# Altium footprint library devices.PCBLIB: 335 footprints (part 13 of 21)
Each footprint in its own frame and in the unit in brackets; x right, y up, seen from the top. Pads: shape width x height; smd on the part's side, far side on the other; paste and mask are expansions set on the pad; w line width, h text height; cw(c..) or ccw(c..) is an arc to the next point about the centre after c.
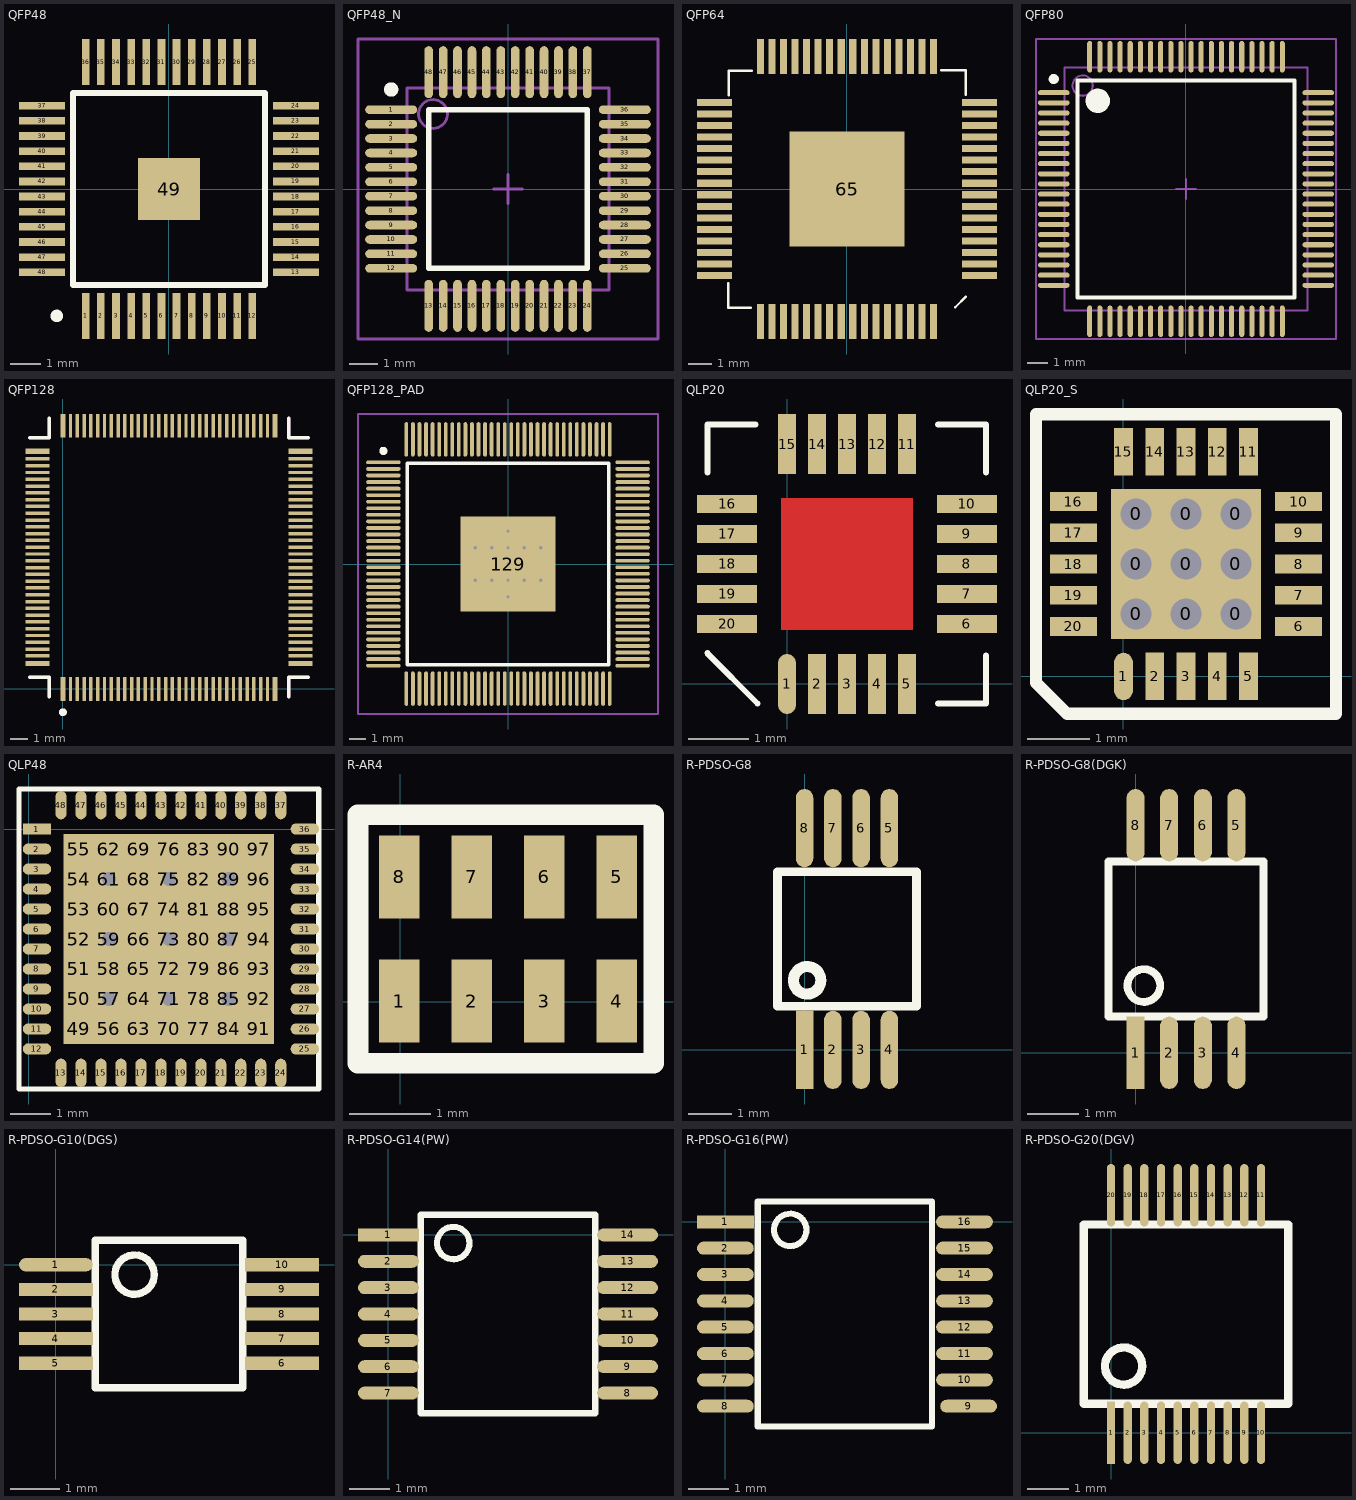
[diagram p12: the footprints below, top view; thin cyan lines are the x and y axes]

## QFP48 [mil]
pads (49):
  rect 10x60 smd: 1(-108.27,-165) 2(-88.58,-165) 3(-68.9,-165) 4(-49.21,-165) 5(-29.53,-165) 6(-9.84,-165) 7(9.84,-165) 8(29.53,-165) 9(49.21,-165) 10(68.9,-165) 11(88.58,-165) 12(108.27,-165) 25(108.27,165) 26(88.58,165) 27(68.9,165) 28(49.21,165) 29(29.53,165) 30(9.84,165) 31(-9.84,165) 32(-29.53,165) 33(-49.21,165) 34(-68.9,165) 35(-88.58,165) 36(-108.27,165)
  rect 60x10 smd: 13(165,-108.27) 14(165,-88.58) 15(165,-68.9) 16(165,-49.21) 17(165,-29.53) 18(165,-9.84) 19(165,9.84) 20(165,29.53) 21(165,49.21) 22(165,68.9) 23(165,88.58) 24(165,108.27) 37(-165,108.27) 38(-165,88.58) 39(-165,68.9) 40(-165,49.21) 41(-165,29.53) 42(-165,9.84) 43(-165,-9.84) 44(-165,-29.53) 45(-165,-49.21) 46(-165,-68.9) 47(-165,-88.58) 48(-165,-108.27)
  rect 80x80 smd: 49(0,0)
Top Overlay:
  circle w8: c-145.81,-165 r4.19
  lines w8: -125,-125 125,-125 125,125 -125,125 -125,-125

## QFP48_N [mm] "Thin QFP, 48-Leads, Body 7x7mm, Pitch 0.5mm, IPC Medium Density"
height 1.2
pads (48):
  oval 1.8x0.3 smd: 1(-4.05,2.75) 2(-4.05,2.25) 3(-4.05,1.75) 4(-4.05,1.25) 5(-4.05,0.75) 6(-4.05,0.25) 7(-4.05,-0.25) 8(-4.05,-0.75) 9(-4.05,-1.25) 10(-4.05,-1.75) 11(-4.05,-2.25) 12(-4.05,-2.75) 25(4.05,-2.75) 26(4.05,-2.25) 27(4.05,-1.75) 28(4.05,-1.25) 29(4.05,-0.75) 30(4.05,-0.25) 31(4.05,0.25) 32(4.05,0.75) 33(4.05,1.25) 34(4.05,1.75) 35(4.05,2.25) 36(4.05,2.75)
  oval 0.3x1.8 smd: 13(-2.75,-4.05) 14(-2.25,-4.05) 15(-1.75,-4.05) 16(-1.25,-4.05) 17(-0.75,-4.05) 18(-0.25,-4.05) 19(0.25,-4.05) 20(0.75,-4.05) 21(1.25,-4.05) 22(1.75,-4.05) 23(2.25,-4.05) 24(2.75,-4.05) 37(2.75,4.05) 38(2.25,4.05) 39(1.75,4.05) 40(1.25,4.05) 41(0.75,4.05) 42(0.25,4.05) 43(-0.25,4.05) 44(-0.75,4.05) 45(-1.25,4.05) 46(-1.75,4.05) 47(-2.25,4.05) 48(-2.75,4.05)
Top Overlay:
  circle w0.25: c-4.05,3.45 r0.125
  lines w0.2: -2.75,-2.75 2.75,-2.75 2.75,2.75 -2.75,2.75 -2.75,-2.75
Mechanical 13:
  circle w0.1: c-2.6,2.6 r0.5
  lines w0.1: -3.5,-3.5 3.5,-3.5 3.5,3.5 -3.5,3.5 -3.5,-3.5
Mechanical 15:
  lines w0.1: -0.5,0 0.5,0 ; 0,-0.5 0,0.5 ; -5.2,-5.2 5.2,-5.2 5.2,5.2 -5.2,5.2 -5.2,-5.2
3D body: height 1.2, standoff 0, extent -3.5,-3.5 3.5,3.5

## QFP64 [mil]
pads (65):
  rect 60x12 smd: 1(226.5,-147.76) 2(226.5,-128.03) 3(226.5,-108.35) 4(226.5,-88.66) 5(226.5,-68.94) 6(226.5,-49.25) 7(226.5,-29.57) 8(226.5,-9.84) 9(226.5,9.84) 10(226.5,29.57) 11(226.5,49.25) 12(226.5,68.94) 13(226.5,88.66) 14(226.5,108.35) 15(226.5,128.03) 16(226.5,147.76) 33(-226.5,147.76) 34(-226.5,128.03) 35(-226.5,108.35) 36(-226.5,88.66) 37(-226.5,68.94) 38(-226.5,49.25) 39(-226.5,29.57) 40(-226.5,9.84) 41(-226.5,-9.84) 42(-226.5,-29.57) 43(-226.5,-49.25) 44(-226.5,-68.94) 45(-226.5,-88.66) 46(-226.5,-108.35) 47(-226.5,-128.03) 48(-226.5,-147.76)
  rect 12x60 smd: 17(147.76,226.5) 18(128.03,226.5) 19(108.35,226.5) 20(88.66,226.5) 21(68.94,226.5) 22(49.25,226.5) 23(29.57,226.5) 24(9.84,226.5) 25(-9.84,226.5) 26(-29.57,226.5) 27(-49.25,226.5) 28(-68.94,226.5) 29(-88.66,226.5) 30(-108.35,226.5) 31(-128.03,226.5) 32(-147.76,226.5) 49(-147.76,-226.5) 50(-128.03,-226.5) 51(-108.35,-226.5) 52(-88.66,-226.5) 53(-68.94,-226.5) 54(-49.25,-226.5) 55(-29.57,-226.5) 56(-9.84,-226.5) 57(9.84,-226.5) 58(29.57,-226.5) 59(49.25,-226.5) 60(68.94,-226.5) 61(88.66,-226.5) 62(108.35,-226.5) 63(128.03,-226.5) 64(147.76,-226.5)
  rect 197x197 smd: 65(0,0)
Top Overlay:
  lines w4: -202.94,-161 -202.94,-203.51 -203.4,-203.51 -203.4,-203.28 -164.57,-203.28 ; -202.47,159.8 -202.47,202.2 -163.09,202.2 ; 160.63,202.6 160.63,202.87 202.8,202.87 202.8,160.97 ; 185.08,-202.32 203.58,-183.82 ; 203.58,-183.82 203.58,-183.81
Top Paste:
  pour cut-out: 89.04,-88.81 89.04,-20.91 20.59,-20.91 20.59,-88.81
  pour cut-out: -19.65,-88.83 -19.65,-20.93 -88.1,-20.93 -88.1,-88.83
  pour cut-out: -20.16,20.39 -20.16,88.29 -88.61,88.29 -88.61,20.39
  pour cut-out: 89.57,20.41 89.57,88.31 21.12,88.31 21.12,20.41

## QFP80 [mm] "Thin QFP, 80-Leads, Body 12x12mm, Pitch 0.5mm, IPC High Density"
height 1.6
pads (80):
  oval 1.55x0.25 smd: 1(-6.525,4.75) 2(-6.525,4.25) 3(-6.525,3.75) 4(-6.525,3.25) 5(-6.525,2.75) 6(-6.525,2.25) 7(-6.525,1.75) 8(-6.525,1.25) 9(-6.525,0.75) 10(-6.525,0.25) 11(-6.525,-0.25) 12(-6.525,-0.75) 13(-6.525,-1.25) 14(-6.525,-1.75) 15(-6.525,-2.25) 16(-6.525,-2.75) 17(-6.525,-3.25) 18(-6.525,-3.75) 19(-6.525,-4.25) 20(-6.525,-4.75) 41(6.525,-4.75) 42(6.525,-4.25) 43(6.525,-3.75) 44(6.525,-3.25) 45(6.525,-2.75) 46(6.525,-2.25) 47(6.525,-1.75) 48(6.525,-1.25) 49(6.525,-0.75) 50(6.525,-0.25) 51(6.525,0.25) 52(6.525,0.75) 53(6.525,1.25) 54(6.525,1.75) 55(6.525,2.25) 56(6.525,2.75) 57(6.525,3.25) 58(6.525,3.75) 59(6.525,4.25) 60(6.525,4.75)
  oval 0.25x1.55 smd: 21(-4.75,-6.525) 22(-4.25,-6.525) 23(-3.75,-6.525) 24(-3.25,-6.525) 25(-2.75,-6.525) 26(-2.25,-6.525) 27(-1.75,-6.525) 28(-1.25,-6.525) 29(-0.75,-6.525) 30(-0.25,-6.525) 31(0.25,-6.525) 32(0.75,-6.525) 33(1.25,-6.525) 34(1.75,-6.525) 35(2.25,-6.525) 36(2.75,-6.525) 37(3.25,-6.525) 38(3.75,-6.525) 39(4.25,-6.525) 40(4.75,-6.525) 61(4.75,6.525) 62(4.25,6.525) 63(3.75,6.525) 64(3.25,6.525) 65(2.75,6.525) 66(2.25,6.525) 67(1.75,6.525) 68(1.25,6.525) 69(0.75,6.525) 70(0.25,6.525) 71(-0.25,6.525) 72(-0.75,6.525) 73(-1.25,6.525) 74(-1.75,6.525) 75(-2.25,6.525) 76(-2.75,6.525) 77(-3.25,6.525) 78(-3.75,6.525) 79(-4.25,6.525) 80(-4.75,6.525)
Top Overlay:
  circle w0.25: c-6.525,5.425 r0.125
  circle w0.6: c-4.35,4.35 r0.3
  lines w0.2: -5.35,-5.35 -5.35,5.35 5.35,5.35 5.35,-5.35 -5.35,-5.35
Mechanical 13:
  circle w0.1: c-5.1,5.1 r0.5
  lines w0.1: -6,-6 -6,6 6,6 6,-6 -6,-6
Mechanical 15:
  lines w0.1: -0.5,0 0.5,0 ; 0,-0.5 0,0.5 ; -7.4,-7.4 -7.4,7.4 7.4,7.4 7.4,-7.4 -7.4,-7.4
3D body: height 1.6, standoff 0, extent -6,-6 6,6

## QFP128 [mil]
pads (128):
  rect 12x55 smd: 1(0,0) 32(492.18,0) 65(492.18,610) 96(0,610)
  rect 8x55 smd: 2(17.74,0) 3(33.49,0) 4(49.24,0) 5(64.99,0) 6(80.74,0) 7(96.48,0) 8(112.23,0) 9(127.98,0) 10(143.73,0) 11(159.48,0) 12(175.22,0) 13(190.97,0) 14(206.72,0) 15(222.47,0) 16(238.22,0) 17(253.96,0) 18(269.71,0) 19(285.46,0) 20(301.21,0) 21(316.96,0) 22(332.7,0) 23(348.45,0) 24(364.2,0) 25(379.95,0) 26(395.7,0) 27(411.44,0) 28(427.19,0) 29(442.94,0) 30(458.69,0) 31(474.44,0) 66(474.44,610) 67(458.69,610) 68(442.94,610) 69(427.19,610) 70(411.44,610) 71(395.7,610) 72(379.95,610) 73(364.2,610) 74(348.45,610) 75(332.7,610) 76(316.96,610) 77(301.21,610) 78(285.46,610) 79(269.71,610) 80(253.96,610) 81(238.22,610) 82(222.47,610) 83(206.72,610) 84(190.97,610) 85(175.22,610) 86(159.48,610) 87(143.73,610) 88(127.98,610) 89(112.23,610) 90(96.48,610) 91(80.74,610) 92(64.99,610) 93(49.24,610) 94(33.49,610) 95(17.74,610)
  rect 55x12 smd: 33(551.09,58.91) 64(551.09,551.09) 97(-58.91,551.09) 128(-58.91,58.91)
  rect 55x8 smd: 34(551.09,76.65) 35(551.09,92.4) 36(551.09,108.15) 37(551.09,123.9) 38(551.09,139.65) 39(551.09,155.39) 40(551.09,171.14) 41(551.09,186.89) 42(551.09,202.64) 43(551.09,218.39) 44(551.09,234.13) 45(551.09,249.88) 46(551.09,265.63) 47(551.09,281.38) 48(551.09,297.13) 49(551.09,312.87) 50(551.09,328.62) 51(551.09,344.37) 52(551.09,360.12) 53(551.09,375.87) 54(551.09,391.61) 55(551.09,407.36) 56(551.09,423.11) 57(551.09,438.86) 58(551.09,454.61) 59(551.09,470.35) 60(551.09,486.1) 61(551.09,501.85) 62(551.09,517.6) 63(551.09,533.35) 98(-58.91,533.35) 99(-58.91,517.6) 100(-58.91,501.85) 101(-58.91,486.1) 102(-58.91,470.35) 103(-58.91,454.61) 104(-58.91,438.86) 105(-58.91,423.11) 106(-58.91,407.36) 107(-58.91,391.61) 108(-58.91,375.87) 109(-58.91,360.12) 110(-58.91,344.37) 111(-58.91,328.62) 112(-58.91,312.87) 113(-58.91,297.13) 114(-58.91,281.38) 115(-58.91,265.63) 116(-58.91,249.88) 117(-58.91,234.13) 118(-58.91,218.39) 119(-58.91,202.64) 120(-58.91,186.89) 121(-58.91,171.14) 122(-58.91,155.39) 123(-58.91,139.65) 124(-58.91,123.9) 125(-58.91,108.15) 126(-58.91,92.4) 127(-58.91,76.65)
Top Overlay:
  circle w10: c0.09,-54 r4.12
  lines w8: -76.74,27.44 -31.47,27.44 -31.47,-17.83 ; -76.74,582.56 -31.47,582.56 -31.47,627.83 ; 523.65,-17.83 523.65,27.44 568.92,27.44 ; 523.65,627.83 523.65,582.56 568.92,582.56
Mechanical 11:
  lines w8: -76.74,27.44 -31.47,27.44 -31.47,-17.83 ; -76.74,582.56 -31.47,582.56 -31.47,627.83 ; 523.65,-17.83 523.65,27.44 568.92,27.44 ; 523.65,627.83 523.65,582.56 568.92,582.56

## QFP128_PAD [mm]
pads (129):
  oval 2.1x0.23 smd: 1(-7.6,6.2) 2(-7.6,5.8) 3(-7.6,5.4) 4(-7.6,5) 5(-7.6,4.6) 6(-7.6,4.2) 7(-7.6,3.8) 8(-7.6,3.4) 9(-7.6,3) 10(-7.6,2.6) 11(-7.6,2.2) 12(-7.6,1.8) 13(-7.6,1.4) 14(-7.6,1) 15(-7.6,0.6) 16(-7.6,0.2) 17(-7.6,-0.2) 18(-7.6,-0.6) 19(-7.6,-1) 20(-7.6,-1.4) 21(-7.6,-1.8) 22(-7.6,-2.2) 23(-7.6,-2.6) 24(-7.6,-3) 25(-7.6,-3.4) 26(-7.6,-3.8) 27(-7.6,-4.2) 28(-7.6,-4.6) 29(-7.6,-5) 30(-7.6,-5.4) 31(-7.6,-5.8) 32(-7.6,-6.2) 65(7.6,-6.2) 66(7.6,-5.8) 67(7.6,-5.4) 68(7.6,-5) 69(7.6,-4.6) 70(7.6,-4.2) 71(7.6,-3.8) 72(7.6,-3.4) 73(7.6,-3) 74(7.6,-2.6) 75(7.6,-2.2) 76(7.6,-1.8) 77(7.6,-1.4) 78(7.6,-1) 79(7.6,-0.6) 80(7.6,-0.2) 81(7.6,0.2) 82(7.6,0.6) 83(7.6,1) 84(7.6,1.4) 85(7.6,1.8) 86(7.6,2.2) 87(7.6,2.6) 88(7.6,3) 89(7.6,3.4) 90(7.6,3.8) 91(7.6,4.2) 92(7.6,4.6) 93(7.6,5) 94(7.6,5.4) 95(7.6,5.8) 96(7.6,6.2)
  oval 0.23x2.1 smd: 33(-6.2,-7.6) 34(-5.8,-7.6) 35(-5.4,-7.6) 36(-5,-7.6) 37(-4.6,-7.6) 38(-4.2,-7.6) 39(-3.8,-7.6) 40(-3.4,-7.6) 41(-3,-7.6) 42(-2.6,-7.6) 43(-2.2,-7.6) 44(-1.8,-7.6) 45(-1.4,-7.6) 46(-1,-7.6) 47(-0.6,-7.6) 48(-0.2,-7.6) 49(0.2,-7.6) 50(0.6,-7.6) 51(1,-7.6) 52(1.4,-7.6) 53(1.8,-7.6) 54(2.2,-7.6) 55(2.6,-7.6) 56(3,-7.6) 57(3.4,-7.6) 58(3.8,-7.6) 59(4.2,-7.6) 60(4.6,-7.6) 61(5,-7.6) 62(5.4,-7.6) 63(5.8,-7.6) 64(6.2,-7.6) 97(6.2,7.6) 98(5.8,7.6) 99(5.4,7.6) 100(5,7.6) 101(4.6,7.6) 102(4.2,7.6) 103(3.8,7.6) 104(3.4,7.6) 105(3,7.6) 106(2.6,7.6) 107(2.2,7.6) 108(1.8,7.6) 109(1.4,7.6) 110(1,7.6) 111(0.6,7.6) 112(0.2,7.6) 113(-0.2,7.6) 114(-0.6,7.6) 115(-1,7.6) 116(-1.4,7.6) 117(-1.8,7.6) 118(-2.2,7.6) 119(-2.6,7.6) 120(-3,7.6) 121(-3.4,7.6) 122(-3.8,7.6) 123(-4.2,7.6) 124(-4.6,7.6) 125(-5,7.6) 126(-5.4,7.6) 127(-5.8,7.6) 128(-6.2,7.6)
  rect 5.8x5.8 smd: 129(0,0)
via 0,0 diameter 0.508 hole 0.203
via 0,1 diameter 0.508 hole 0.203
via 0,-1 diameter 0.508 hole 0.203
via 0,2 diameter 0.508 hole 0.203
via -1,1 diameter 0.508 hole 0.203
via -1,-1 diameter 0.508 hole 0.203
via 1,-1 diameter 0.508 hole 0.203
via 1,1 diameter 0.508 hole 0.203
via 0,-2 diameter 0.508 hole 0.203
via -2,1 diameter 0.508 hole 0.203
via -2,-1 diameter 0.508 hole 0.203
via 2,1 diameter 0.508 hole 0.203
via 2,-1 diameter 0.508 hole 0.203
Top Overlay:
  circle w0.25: c-7.6,6.9 r0.125
  lines w0.2: -6.15,-6.15 6.15,-6.15 6.15,6.15 -6.15,6.15 -6.15,-6.15
Mechanical 15:
  lines w0.1: -0.5,0 0.5,0 ; 0,-0.5 0,0.5 ; -9.15,-9.15 9.15,-9.15 9.15,9.15 -9.15,9.15 -9.15,-9.15

## QLP20 [mm]
pads (20):
  oval 0.3x1 smd: 1(0,0)
  rect 0.3x1 smd: 2(0.5,0) 3(1,0) 4(1.5,0) 5(2,0) 11(2,4) 12(1.5,4) 13(1,4) 14(0.5,4) 15(0,4)
  rect 1x0.3 smd: 6(3,1) 7(3,1.5) 8(3,2) 9(3,2.5) 10(3,3) 16(-1,3) 17(-1,2.5) 18(-1,2) 19(-1,1.5) 20(-1,1)
Top Layer:
  rectangle: -0.1,0.9 2.1,3.1
Top Overlay:
  lines w0.1: -1.329,0.514 -0.491,-0.324 ; -1.329,3.524 -1.329,4.324 -0.529,4.324 ; 2.519,-0.324 3.319,-0.324 3.319,0.476 ; 2.519,4.324 3.319,4.324 3.319,3.524

## QLP20_S [mm]
pads (29):
  rect 0.8x0.8 hole 0.5: 0(0.2,1) 0(0.2,1.8) 0(0.2,2.6) 0(1,1) 0(1,1.8) 0(1,2.6) 0(1.8,1) 0(1.8,1.8) 0(1.8,2.6)
  oval 0.3x0.76 smd: 1(0,0)
  rect 0.3x0.76 smd: 2(0.5,0) 3(1,0) 4(1.5,0) 5(2,0) 11(2,3.6) 12(1.5,3.6) 13(1,3.6) 14(0.5,3.6) 15(0,3.6)
  rect 0.76x0.3 smd: 6(2.8,0.8) 7(2.8,1.3) 8(2.8,1.8) 9(2.8,2.3) 10(2.8,2.8) 16(-0.8,2.8) 17(-0.8,2.3) 18(-0.8,1.8) 19(-0.8,1.3) 20(-0.8,0.8)
Top Overlay:
  lines w0.2: -1.4,-0.1 -1.4,4.2 3.4,4.2 3.4,-0.6 -0.9,-0.6 -1.4,-0.1

## QLP48 [mil]
pads (123):
  rect 0x0 / inner round 0 / far side round 0 all layers, no hole: 1(0,0) 2(0,-19.69) 3(0,-39.37) 4(0,-59.06) 5(0,-78.74) 6(0,-98.43) 7(0,-118.11) 8(0,-137.8) 9(0,-157.48) 10(0,-177.17) 14(50.79,-247.64) 15(70.47,-247.64) 17(109.84,-247.64) 18(129.53,-247.64) 19(149.21,-247.64) 20(168.9,-247.64) 21(188.58,-247.64) 22(208.27,-247.64) 23(227.95,-247.64) 24(247.64,-247.64) 25(278.74,-216.54) 26(278.74,-196.85)
  rect 28x11 smd: 1(7.87,0)
  oval 28x11 smd: 2(7.87,-19.68) 3(7.87,-39.37) 4(7.87,-59.05) 5(7.87,-78.74) 6(7.87,-98.42) 7(7.87,-118.11) 8(7.87,-137.79) 9(7.87,-157.48) 10(7.87,-177.16) 11(7.87,-196.85) 12(7.87,-216.53) 25(271.65,-216.53) 26(271.65,-196.85) 27(271.65,-177.16) 28(271.65,-157.48) 29(271.65,-137.79) 30(271.65,-118.11) 31(271.65,-98.42) 32(271.65,-78.74) 33(271.65,-59.05) 34(271.65,-39.37) 35(271.65,-19.68) 36(271.65,0)
  round 0 all layers, no hole: 11(0,-196.85) 12(0,-216.54) 13(31.1,-247.64) 16(90.16,-247.64)
  oval 11x28 smd: 13(31.5,-240.16) 14(51.18,-240.16) 15(70.87,-240.16) 16(90.55,-240.16) 17(110.24,-240.16) 18(129.92,-240.16) 19(149.61,-240.16) 20(169.29,-240.16) 21(188.98,-240.16) 22(208.66,-240.16) 23(228.35,-240.16) 24(248.03,-240.16) 37(248.03,23.62) 38(228.35,23.62) 39(208.66,23.62) 40(188.98,23.62) 41(169.29,23.62) 42(149.61,23.62) 43(129.92,23.62) 44(110.24,23.62) 45(90.55,23.62) 46(70.87,23.62) 47(51.18,23.62) 48(31.5,23.62)
  rect 30x30 smd: 49(49.21,-196.85) 50(49.21,-167.32) 51(49.21,-137.8) 52(49.21,-108.27) 53(49.21,-78.74) 54(49.21,-49.21) 55(49.21,-19.69) 56(78.74,-196.85) 58(78.74,-137.8) 60(78.74,-78.74) 62(78.74,-19.69) 63(108.27,-196.85) 64(108.27,-167.32) 65(108.27,-137.8) 66(108.27,-108.27) 67(108.27,-78.74) 68(108.27,-49.21) 69(108.27,-19.69) 70(137.8,-196.85) 72(137.8,-137.8) 74(137.8,-78.74) 76(137.8,-19.69) 77(167.32,-196.85) 78(167.32,-167.32) 79(167.32,-137.8) 80(167.32,-108.27) 81(167.32,-78.74) 82(167.32,-49.21) 83(167.32,-19.69) 84(196.85,-196.85) 86(196.85,-137.8) 88(196.85,-78.74) 90(196.85,-19.69) 91(226.38,-196.85) 92(226.38,-167.32) 93(226.38,-137.8) 94(226.38,-108.27) 95(226.38,-78.74) 96(226.38,-49.21) 97(226.38,-19.69)
  rect 30x30 hole 14: 57(78.74,-167.32) 59(78.74,-108.27) 61(78.74,-49.21) 71(137.8,-167.32) 73(137.8,-108.27) 75(137.8,-49.21) 85(196.85,-167.32) 87(196.85,-108.27) 89(196.85,-49.21)
Top Overlay:
  lines w5: -9.84,-255.91 285.43,-255.91 285.43,39.37 -9.84,39.37 -9.84,-255.91

## R-AR4 [mm]
pads (8):
  rect 0.5x1.016 smd: 1(-0.012,0.011) 2(0.877,0.011) 3(1.766,0.011) 4(2.655,0.011) 5(2.655,1.535) 6(1.766,1.535) 7(0.877,1.535) 8(-0.012,1.535)
Top Overlay:
  lines w0.254: 3.061,-0.751 -0.52,-0.751 -0.52,2.297 3.112,2.297 3.112,-0.751

## R-PDSO-G8 [mm]
pads (8):
  rect 0.4x1.8 smd: 1(0,0)
  oval 0.4x1.8 smd: 2(0.65,0) 3(1.3,0) 4(1.95,0) 5(1.95,5.1) 6(1.3,5.1) 7(0.65,5.1) 8(0,5.1)
Top Overlay:
  circle w0.254: c0.059,1.6 r0.316
  lines w0.2: -0.625,1 -0.625,4.1 2.575,4.1 2.575,1 -0.625,1

## R-PDSO-G8(DGK) [mm]
pads (8):
  rect 0.35x1.4 smd: 1(0,0)
  oval 0.35x1.4 smd: 2(0.65,0) 3(1.3,0) 4(1.95,0) 5(1.95,4.4) 6(1.3,4.4) 7(0.65,4.4) 8(0,4.4)
Top Overlay:
  circle w0.15: c0.159,1.3 r0.316
  lines w0.15: -0.525,0.7 -0.525,3.7 2.475,3.7 2.475,0.7 -0.525,0.7

## R-PDSO-G10(DGS) [mm]
pads (10):
  oval 1.5x0.27 smd: 1(0,0)
  rect 1.5x0.27 smd: 2(0,-0.5) 3(0,-1) 4(0,-1.5) 5(0,-2) 6(4.6,-2) 7(4.6,-1.5) 8(4.6,-1) 9(4.6,-0.5) 10(4.6,0)
Top Overlay:
  circle w0.15: c1.6,-0.2 r0.4
  lines w0.152: 0.8,-2.5 0.8,0.5 3.8,0.5 3.8,-2.5 0.8,-2.5

## R-PDSO-G14(PW) [mm]
pads (14):
  rect 1.5x0.32 smd: 1(0,0)
  oval 1.5x0.32 smd: 2(0,-0.65) 3(0,-1.3) 4(0,-1.95) 5(0,-2.6) 6(0,-3.25) 7(0,-3.9) 8(5.9,-3.9) 9(5.9,-3.25) 10(5.9,-2.6) 11(5.9,-1.95) 12(5.9,-1.3) 13(5.9,-0.65) 14(5.9,0)
Top Overlay:
  circle w0.15: c1.6,-0.2 r0.4
  lines w0.152: 5.093,-4.4 0.8,-4.4 0.8,0.5 5.1,0.5 5.1,-4.4

## R-PDSO-G16(PW) [mm]
pads (16):
  rect 1.4x0.32 smd: 1(0,0)
  oval 1.4x0.32 smd: 2(0,-0.65) 3(0,-1.3) 4(0,-1.95) 5(0,-2.6) 6(0,-3.25) 7(0,-3.9) 8(0,-4.55) 9(6,-4.55) 10(5.9,-3.9) 11(5.9,-3.25) 12(5.9,-2.6) 13(5.9,-1.95) 14(5.9,-1.3) 15(5.9,-0.65) 16(5.9,0)
Top Overlay:
  circle w0.15: c1.6,-0.2 r0.4
  lines w0.152: 5.093,-5.05 0.8,-5.05 0.8,0.5 5.1,0.5 5.1,-5.05

## R-PDSO-G20(DGV) [mm]
pads (20):
  rect 0.2x1.5 smd: 1(0,0)
  oval 0.2x1.5 smd: 2(0.4,0) 3(0.8,0) 4(1.2,0) 5(1.6,0) 6(2,0) 7(2.4,0) 8(2.8,0) 9(3.2,0) 10(3.6,0) 11(3.6,5.7) 12(3.2,5.7) 13(2.8,5.7) 14(2.4,5.7) 15(2,5.7) 16(1.6,5.7) 17(1.2,5.7) 18(0.8,5.7) 19(0.4,5.7) 20(0,5.7)
Top Overlay:
  circle w0.2: c0.303,1.6 r0.447
  lines w0.2: -0.65,0.7 4.25,0.7 4.25,5 -0.65,5 -0.65,0.7